# Altium footprint library Passive Pad Lib.PcbLib: 110 footprints (part 3 of 7)
Each footprint in its own frame and in the unit in brackets; x right, y up, seen from the top. Pads: shape width x height; smd on the part's side, far side on the other; paste and mask are expansions set on the pad; w line width, h text height; cw(c..) or ccw(c..) is an arc to the next point about the centre after c.
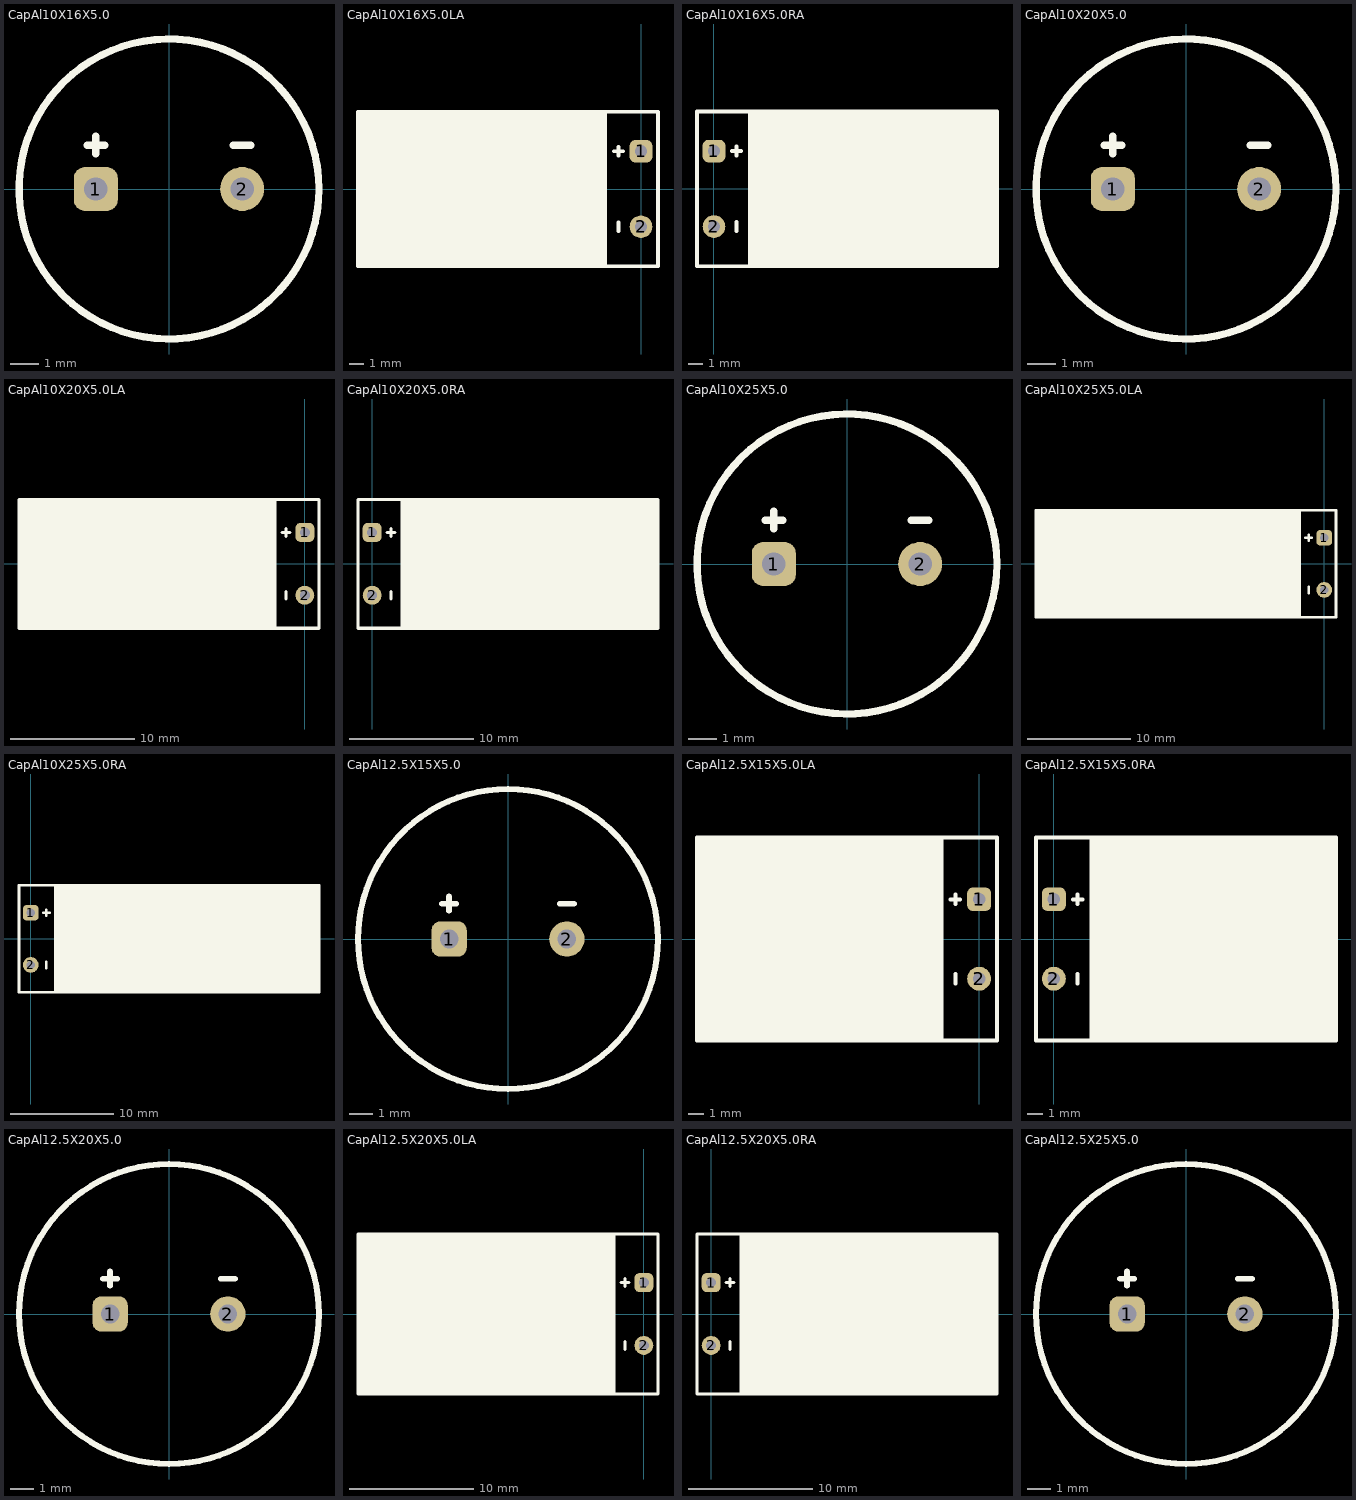
[diagram p2: the footprints below, top view; thin cyan lines are the x and y axes]

## CapAl10X16X5.0 [mil] "Aluminum Electrolytic Capacitors (Size:10X16X5.0mm,Straight)"
pads (2):
  rrect50% 60x60 hole 32: 1(-100,0)
  round 60 hole 32: 2(100,0)
Top Overlay:
  circle w10: c0,0 r205
  lines w10: -112,60 -88,60 ; -100,48 -100,72 ; 88,60 112,60
3D body "THD Capacitor Polar 10x16x5mm.step": height 645.61, standoff -133.81, extent -197.85,-197.85 197.85,197.85

## CapAl10X16X5.0LA [mil] "Aluminum Electrolytic Capacitors (Size:10X16X5.0mm, Angled Left)"
pads (2):
  rrect50% 60x60 hole 32: 1(0,100)
  round 60 hole 32: 2(0,-100)
Top Overlay:
  region: -90,-205 -90,205 -750,205 -750,-205
  lines w10: -72,100 -48,100 ; -60,-112 -60,-88 ; -60,88 -60,112 ; -750,-205 45,-205 45,205 -750,205 -750,-205
3D body "THD Capacitor Polar 10x16x5mm LA.step": height 397.85, standoff -116.93, extent -748.6,-197.85 12.32,197.85

## CapAl10X16X5.0RA [mil] "Aluminum Electrolytic Capacitors (Size:10X16X5.0mm, Angled Right)"
pads (2):
  rrect50% 60x60 hole 32: 1(0,100)
  round 60 hole 32: 2(0,-100)
Top Overlay:
  region: 89.5,205 89.5,-206 750,-206 750,205
  lines w10: 48,100 72,100 ; 60,-112 60,-88 ; 60,88 60,112 ; -45,-205 -45,205 750,205 750,-205 -45,-205
3D body "THD Capacitor Polar 10x16x5mm RA.step": height 397.85, standoff -116.93, extent -12.15,-197.85 748.61,197.85

## CapAl10X20X5.0 [mil] "Aluminum Electrolytic Capacitors (Size:10X20X5.0mm,Straight)"
pads (2):
  rrect50% 60x60 hole 32: 1(-100,0)
  round 60 hole 32: 2(100,0)
Top Overlay:
  circle w10: c0,0 r205
  lines w10: -112,60 -88,60 ; -100,48 -100,72 ; 88,60 112,60
3D body "THD Capacitor Polar 10x20x5mm.step": height 803.09, standoff -133.81, extent -197.85,-197.85 197.85,197.85

## CapAl10X20X5.0LA [mil] "Aluminum Electrolytic Capacitors (Size:10X20X5.0mm, Angled Left)"
pads (2):
  rrect50% 60x60 hole 32: 1(0,100)
  round 60 hole 32: 2(0,-100)
Top Overlay:
  region: -90,-206 -90,205 -910,205 -910,-206
  lines w10: -72,100 -48,100 ; -60,-112 -60,-88 ; -60,88 -60,112 ; -910,-205 -910,205 45,205 45,-205 -910,-205
3D body "THD Capacitor Polar 10x20x5mm LA.step": height 397.85, standoff -116.93, extent -906.08,-197.85 12.32,197.85

## CapAl10X20X5.0RA [mil] "Aluminum Electrolytic Capacitors (Size:10X20X5.0mm, Angled Right)"
pads (2):
  rrect50% 60x60 hole 32: 1(0,100)
  round 60 hole 32: 2(0,-100)
Top Overlay:
  region: 89.5,205 89.5,-206 910,-206 910,205
  lines w10: 48,100 72,100 ; 60,-112 60,-88 ; 60,88 60,112 ; -45,-205 -45,205 910,205 910,-205 -45,-205
3D body "THD Capacitor Polar 10x20x5mm RA.step": height 397.85, standoff -116.93, extent -12.15,-197.85 906.09,197.85

## CapAl10X25X5.0 [mil] "Aluminum Electrolytic Capacitors (Size:10X25X5.0mm,Straight)"
pads (2):
  rrect50% 60x60 hole 32: 1(-100,0)
  round 60 hole 32: 2(100,0)
Top Overlay:
  circle w10: c0,0 r205
  lines w10: -112,60 -88,60 ; -100,48 -100,72 ; 88,60 112,60
3D body "THD Capacitor Polar 10x25x5mm.step": height 999.94, standoff -133.81, extent -197.85,-197.85 197.85,197.85

## CapAl10X25X5.0LA [mil] "Aluminum Electrolytic Capacitors (Size:10X25X5.0mm, Angled Left)"
pads (2):
  rrect50% 60x60 hole 32: 1(0,100)
  round 60 hole 32: 2(0,-100)
Top Overlay:
  region: -90,-206 -90,205 -1105,205 -1105,-206
  lines w10: -72,100 -48,100 ; -60,-112 -60,-88 ; -60,88 -60,112 ; -1105,-205 45,-205 45,205 -1105,205 -1105,-205
3D body "THD Capacitor Polar 10x25x5mm LA.step": height 397.85, standoff -116.93, extent -1102.93,-197.85 12.32,197.85

## CapAl10X25X5.0RA [mil] "Aluminum Electrolytic Capacitors (Size:10X25X5.0mm, Angled Right)"
pads (2):
  rrect50% 60x60 hole 32: 1(0,100)
  round 60 hole 32: 2(0,-100)
Top Overlay:
  region: 89.5,205 89.5,-206 1105,-206 1105,205
  lines w10: 48,100 72,100 ; 60,-112 60,-88 ; 60,88 60,112 ; -45,-205 -45,205 1105,205 1105,-205 -45,-205
3D body "THD Capacitor Polar 10x25x5mm RA.step": height 397.85, standoff -116.93, extent -12.15,-197.85 1102.94,197.85

## CapAl12.5X15X5.0 [mil] "Aluminum Electrolytic Capacitors (Size:12.5X15X5.0mm,Straight)"
pads (2):
  rrect50% 60x60 hole 32: 1(-100,0)
  round 60 hole 32: 2(100,0)
Top Overlay:
  circle w10: c0,0 r255
  lines w10: -112,60 -88,60 ; -100,48 -100,72 ; 88,60 112,60
3D body "THD Capacitor Polar 12.5x15x5mm.step": height 606.24, standoff -133.81, extent -247.06,-247.06 247.07,247.07

## CapAl12.5X15X5.0LA [mil] "Aluminum Electrolytic Capacitors (Size:12.5X15X5.0mm, Angled Left)"
pads (2):
  rrect50% 60x60 hole 32: 1(0,100)
  round 60 hole 32: 2(0,-100)
Top Overlay:
  region: -90,-255 -90,255 -710,255 -710,-255
  lines w10: -72,100 -48,100 ; -60,-112 -60,-88 ; -60,88 -60,112 ; -710,-255 -710,255 45,255 45,-255 -710,-255
3D body "THD Capacitor Polar 12.5x15x5mm LA.step": height 497.06, standoff -104.33, extent -709.23,-247.07 12.32,247.06

## CapAl12.5X15X5.0RA [mil] "Aluminum Electrolytic Capacitors (Size:12.5X15X5.0mm, Angled Right)"
pads (2):
  rrect50% 60x60 hole 32: 1(0,100)
  round 60 hole 32: 2(0,-100)
Top Overlay:
  region: 89.5,255 89.5,-255 710,-255 710,255
  lines w10: 48,100 72,100 ; 60,-112 60,-88 ; 60,88 60,112 ; -45,-255 710,-255 710,255 -45,255 -45,-255
3D body "THD Capacitor Polar 12.5x15x5mm RA.step": height 497.06, standoff -104.33, extent -12.15,-247.07 709.24,247.06

## CapAl12.5X20X5.0 [mil] "Aluminum Electrolytic Capacitors (Size:12.5X20X5.0mm,Straight)"
pads (2):
  rrect50% 60x60 hole 32: 1(-100,0)
  round 60 hole 32: 2(100,0)
Top Overlay:
  circle w10: c0,0 r255
  lines w10: -112,60 -88,60 ; -100,48 -100,72 ; 88,60 112,60
3D body "THD Capacitor Polar 12.5x20x5mm.step": height 803.09, standoff -133.81, extent -247.06,-247.06 247.07,247.07

## CapAl12.5X20X5.0LA [mil] "Aluminum Electrolytic Capacitors (Size:12.5X20X5.0mm, Angled Left)"
pads (2):
  rrect50% 60x60 hole 32: 1(0,100)
  round 60 hole 32: 2(0,-100)
Top Overlay:
  region: -90,-255 -90,255 -910,255 -910,-255
  lines w10: -72,100 -48,100 ; -60,-112 -60,-88 ; -60,88 -60,112 ; -910,-255 45,-255 45,255 -910,255 -910,-255
3D body "THD Capacitor Polar 12.5x20x5mm LA.step": height 497.06, standoff -104.33, extent -906.08,-247.07 12.32,247.06

## CapAl12.5X20X5.0RA [mil] "Aluminum Electrolytic Capacitors (Size:12.5.X20X5.0mm, Angled Right)"
pads (2):
  rrect50% 60x60 hole 32: 1(0,100)
  round 60 hole 32: 2(0,-100)
Top Overlay:
  region: 89.5,255 89.5,-255 910,-255 910,255
  lines w10: 48,100 72,100 ; 60,-112 60,-88 ; 60,88 60,112 ; -45,-255 -45,255 910,255 910,-255 -45,-255
3D body "THD Capacitor Polar 12.5x20x5mm RA.step": height 497.06, standoff -104.33, extent -12.15,-247.07 906.09,247.06

## CapAl12.5X25X5.0 [mil] "Aluminum Electrolytic Capacitors (Size:12.5X25X5.0mm,Straight)"
pads (2):
  rrect50% 60x60 hole 32: 1(-100,0)
  round 60 hole 32: 2(100,0)
Top Overlay:
  circle w10: c0,0 r255
  lines w10: -112,60 -88,60 ; -100,48 -100,72 ; 88,60 112,60
3D body "THD Capacitor Polar 12.5x25x5mm.step": height 999.94, standoff -133.81, extent -247.06,-247.06 247.07,247.07